# Altium footprint library Conectori.PcbLib: 65 footprints (part 4 of 5)
Each footprint in its own frame and in the unit in brackets; x right, y up, seen from the top. Pads: shape width x height; smd on the part's side, far side on the other; paste and mask are expansions set on the pad; w line width, h text height; cw(c..) or ccw(c..) is an arc to the next point about the centre after c.
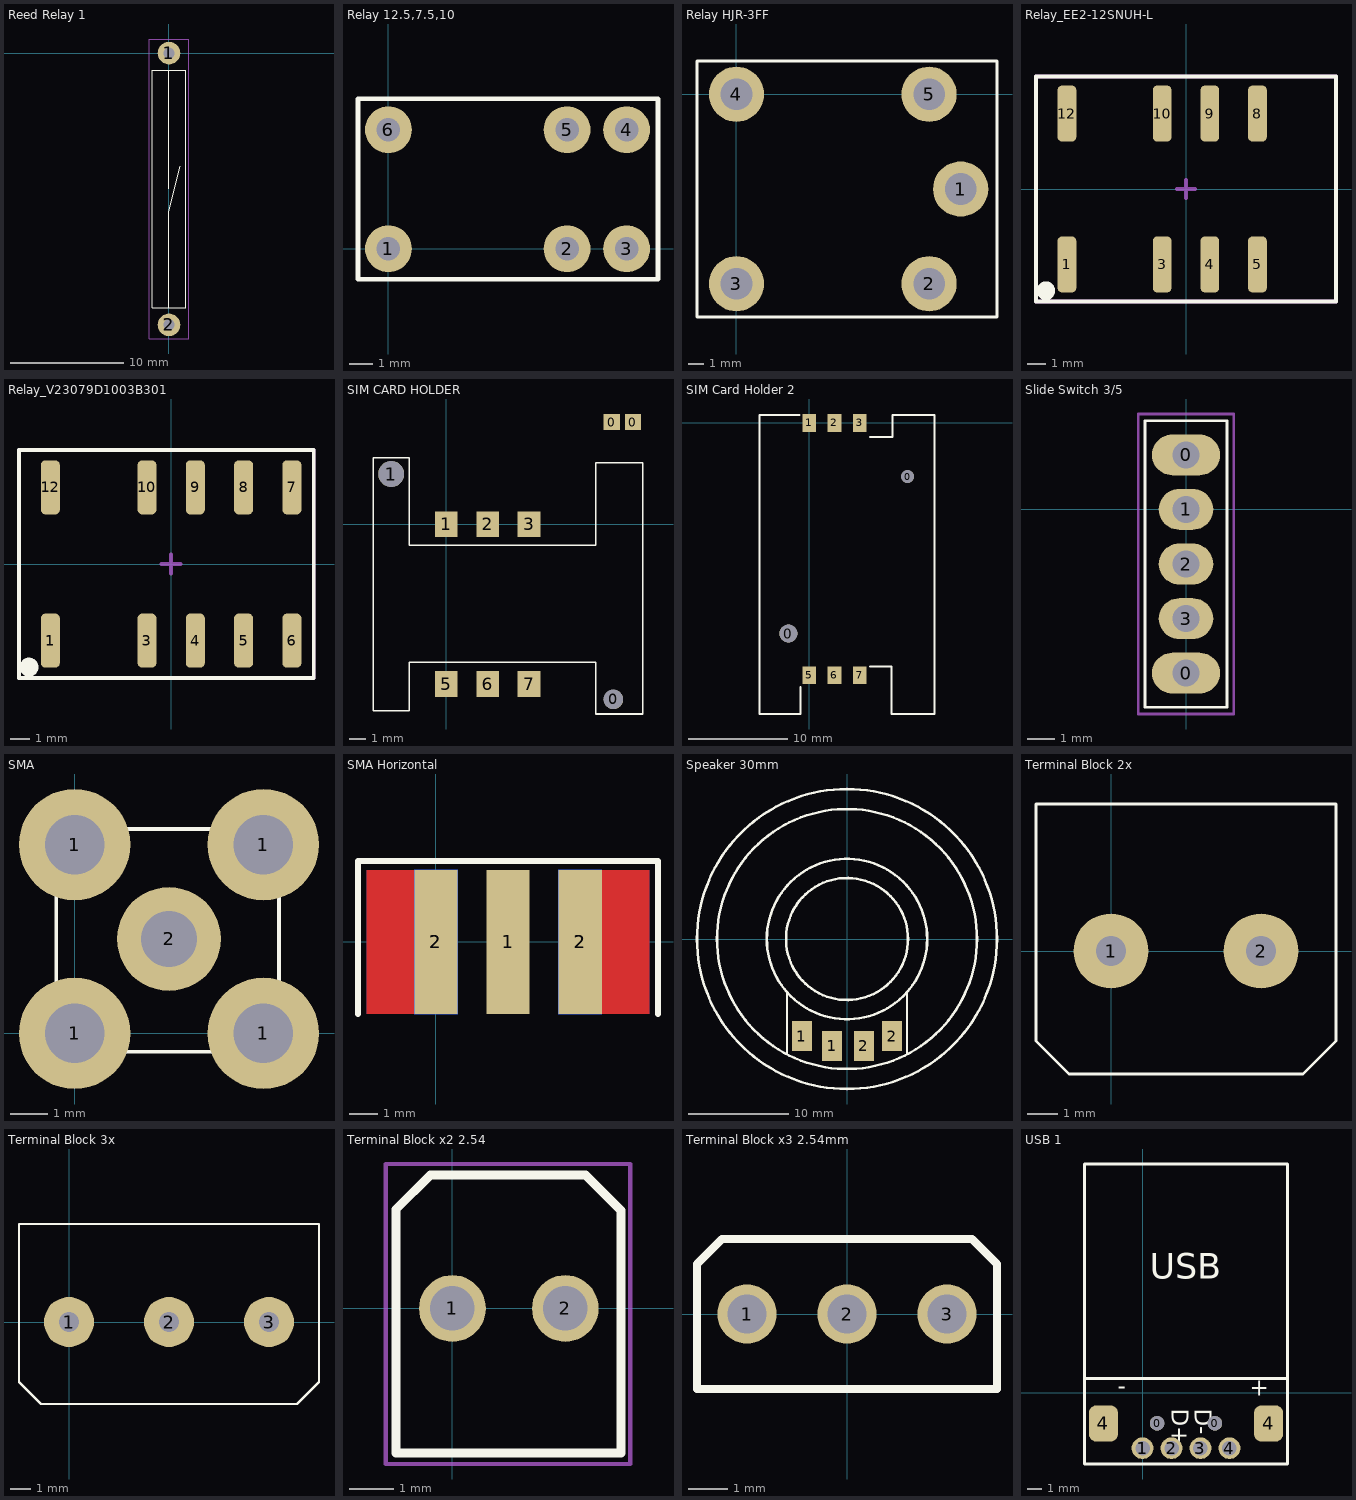
[diagram p3: the footprints below, top view; thin cyan lines are the x and y axes]

## Reed Relay 1 [mm]
height 2.3
pads (2):
  round 2 hole 1: 1(0,0) 2(0,-24)
Top Overlay:
  lines w0.1: 0,-22.5 0,-14 1,-10 ; 0,-12 0,-1.5 ; -1.5,-22.5 -1.5,-1.5 1.5,-1.5 1.5,-22.5 -1.5,-22.5
Mechanical 15:
  lines w0.1: -1.75,-25.25 -1.75,1.25 1.75,1.25 1.75,-3.5 1.75,-25.25 0.25,-25.25 -1.75,-25.25
3D body "User Library-BR.step": height 9, standoff -1, extent -4,-24.6 4,0.6

## Relay 12.5,7.5,10 [mm]
pads (6):
  round 2 hole 1: 1(0,0) 2(7.62,0) 3(10.16,0) 4(10.16,5.08) 5(7.62,5.08) 6(0,5.08)
Top Overlay:
  lines w0.2: -1.3,-1.3 -1.1,-1.3 11.5,-1.3 11.5,-1.2 11.5,6.4 -1.3,6.4 -1.3,-1.3
3D body: height 10, standoff 0, extent -1.3,-1.3 11.5,6.4

## Relay HJR-3FF [mm]
height 15.5
pads (5):
  round 3.5 hole 2: 1(14.2,-6) 2(12.2,-12) 3(0,-12) 4(0,0) 5(12.2,0)
Top Overlay:
  lines w0.2: -2.5,-14.1 11.7,-14.1 16.5,-14.1 16.5,-13.8 16.5,1.7 16.5,2.1 1.5,2.1 -2.5,2.1 -2.5,1.7 -2.5,-13.8 -2.5,-14.1
3D body: height 15.5, standoff 0, extent -2.5,-14.1 16.5,2.1

## Relay_EE2-12SNUH-L [mm] "Relay, SMD, 10 Pins"
height 10.5
pads (8):
  rrect50% 1x3 smd: 1(-6.35,-4.025) 3(-1.27,-4.025) 4(1.27,-4.025) 5(3.81,-4.025) 8(3.81,4.025) 9(1.27,4.025) 10(-1.27,4.025) 12(-6.35,4.025)
Top Overlay:
  circle w0.5: c-7.475,-5.425 r0.25
  lines w0.2: -8,-6 -8,6 8,6 8,-6 -8,-6
Mechanical 15:
  lines w0.2: -0.5,0 0.5,0 ; 0,-0.5 0,0.5 ; -8,-6 8,-6 8,6 -8,6 -8,-6
3D body: height 10.5, standoff 0, extent -7.4,-3.7 7.6,3.7

## Relay_V23079D1003B301 [mm] "Relay, SMD, 10 Pins"
height 10.5
pads (10):
  rrect50% 1x2.85 smd: 1(-6.35,-4.025) 3(-1.27,-4.025) 4(1.27,-4.025) 5(3.81,-4.025) 6(6.35,-4.025) 7(6.35,4.025) 8(3.81,4.025) 9(1.27,4.025) 10(-1.27,4.025) 12(-6.35,4.025)
Top Overlay:
  circle w0.5: c-7.475,-5.425 r0.25
  lines w0.2: -8,-6 7.5,-6 7.5,6 -8,6 -8,-6
Mechanical 15:
  lines w0.2: -0.5,0 0.5,0 ; 0,-0.5 0,0.5 ; -8,-6 -8,6 7.5,6 7.5,-6 -8,-6
3D body: height 10.5, standoff 0, extent -7.25,-3.6 7.25,3.6

## SIM CARD HOLDER [mm]
pads (10):
  rect 1x1 smd: 0(10.2,6.3) 0(11.5,6.3)
  round 1.2 hole 1.2: 0(10.3,-10.8)
  round 1.6 hole 1.6: 1(-3.4,3.1)
  rect 1.4x1.6 smd: 1(0,0) 2(2.55,0) 3(5.1,0) 5(0,-9.85) 6(2.55,-9.85) 7(5.1,-9.85)
Top Overlay:
  lines w0.1: -4.5,-11.5 -4.5,4.1 -2.3,4.1 -2.3,-1.3 5.025,-1.3 9.2,-1.3 9.2,3.8 12.1,3.8 12.1,0.075 12.1,-2 12.1,-11.5 12.1,-11.7 11.912,-11.7 9.2,-11.7 9.2,-10.7 9.2,-8.5 6.9,-8.5 0.4,-8.5 -2.3,-8.5 -2.3,-11 -2.3,-11.5 -4.5,-11.5
3D body: height 2.7, standoff 0, extent -4.5,-11.7 12.1,4.1

## SIM Card Holder 2 [mm]
pads (8):
  round 1.8 hole 1.8: 0(-2.1,-21.2)
  round 1.3 hole 1.3: 0(9.9,-5.4)
  rect 1.4x1.8 smd: 1(0,0) 2(2.54,0) 3(5.08,0) 5(0,-25.4) 6(2.54,-25.4) 7(5.08,-25.4)
Top Overlay:
  lines w0.2: -1,0.8 -4.8,0.8 -5,0.8 -5,-0.3 -5,-29.3 -3.9,-29.3 -0.9,-29.3 -0.9,-26.6 ; 6.1,-24.5 8.3,-24.5 8.3,-27.1 8.3,-29.3 8.6,-29.3 12.6,-29.3 12.6,-28.9 12.6,-9.5 12.6,0.8 9,0.8 8.4,0.8 8.4,-1.4 6.1,-1.4
3D body "User Library-SIM5060-6-0-26-01-A.STEP": height 2.6, standoff -0.7, extent -4.8,-29.11 12.4,0.53

## Slide Switch 3/5 [mm]
height 5
pads (5):
  oval 2.5x1.5 hole 1: 0(0,-6) 0(0,2)
  oval 2x1.5 hole 1: 1(0,0) 2(0,-2) 3(0,-4)
Top Overlay:
  lines w0.1: -1.5,-7.25 -1.5,3.25 1.5,3.25 1.5,-7.25 -1.5,-7.25
Mechanical 15:
  lines w0.1: -1.75,-7.5 -1.75,3.5 1.75,3.5 1.75,-7.5 -1.75,-7.5
3D body "User Library-CK_Slide.step": height 4.7, standoff -2.79, extent -6.25,-6.305 2.123,2.305

## SMA [mm]
pads (5):
  round 3 hole 1.6: 1(0,0) 1(0,5.08) 1(5.08,0) 1(5.08,5.08)
  round 2.8 hole 1.5: 2(2.54,2.54)
Top Overlay:
  lines w0.1: -0.5,-0.5 5.5,-0.5 5.5,5.5 -0.5,5.5 -0.5,-0.5
3D body: height 9.5, standoff 1.7, extent -0.436,-0.454 5.54,5.534
3D body: height 1.7, standoff 0, extent -0.5,-0.5 5.5,5.5

## SMA Horizontal [mm]
pads (5):
  rect 1.5x5 smd: 1(2.5,0) 2(0,0) 2(5,0)
  rect 1.5x5 smd far side: 2(0,0) 2(5,0)
Top Layer:
  rectangle: -2.4,-2.5 -0.7,2.5
  rectangle: 5.7,-2.5 7.4,2.5
Bottom Layer:
  rectangle: -2.4,-2.5 -0.7,2.5
  rectangle: 5.7,-2.5 7.4,2.5
Top Overlay:
  lines w0.2: -2.7,-2.5 -2.7,2.8 -1.1,2.8 5.4,2.8 6.1,2.8 7.7,2.8 7.7,-2.5
Top Solder:
  rectangle: -2.5,-2.6 -0.8,2.6
  rectangle: 5.8,-2.6 7.5,2.6
Bottom Solder:
  rectangle: -2.5,-2.6 -0.8,2.6
  rectangle: 5.8,-2.6 7.5,2.6
3D body "User Library-RP_SMA_PCB-1.step": height 4.46, standoff -3.46, extent -2.26,-14.7 7.26,2.75

## Speaker 30mm [mm]
pads (4):
  rect 2x3 smd: 1(-4.5,-9.7) 1(-1.5,-10.7) 2(1.7,-10.7) 2(4.5,-9.7)
Top Overlay:
  circle w0.254: c0,0 r6.1
  circle w0.254: c0,0 r15
  circle w0.254: c0,0 r13
  circle w0.254: c0,0 r8.016
  lines w0.2: -6,-11.5 -6,-5.3 ; 6,-11.5 6,-5.3
3D body: height 7, standoff 0, extent -10.039,-10.01 9.882,9.951
3D body: height 5, standoff 0, extent -15,-15 14.882,14.941

## Terminal Block 2x [mm]
height 12.5
pads (2):
  round 2.5 hole 1: 1(0,0) 2(5,0)
Top Overlay:
  lines w0.1: -2.5,-3 -2.5,4.9 7.5,4.9 7.5,-3 6.4,-4.1 -1.4,-4.1 -2.5,-3
3D body "User Library-Terminal block 2 POS.STEP": height 10, standoff -3.05, extent -2.58,-3.7 7.58,3.8

## Terminal Block 3x [mm]
height 12.5
pads (3):
  round 2.5 hole 1: 1(0,0) 2(5,0) 3(10,0)
Top Overlay:
  lines w0.1: -2.5,-3 -1.4,-4.1 11.4,-4.1 12.5,-3 12.5,4.9 -2.5,4.9 -2.5,-3
3D body: height 12.5, standoff 0, extent -2.5,-4.1 12.5,4.9

## Terminal Block x2 2.54 [mm]
height 5
pads (2):
  round 1.5 hole 1: 1(0,0) 2(2.54,0)
Top Overlay:
  lines w0.2: -1.27,-3.25 -1.27,2.23 -0.5,3 3,3 3.79,2.21 3.79,-3.25 -1.27,-3.25
Mechanical 15:
  lines w0.1: -1.5,-3.5 -1.5,3.25 4,3.25 4,0.5 4,-3.5 1.5,-3.5 -1.5,-3.5
3D body "User Library-Connector-2.step": height 8.64, standoff -1.91, extent -1.36,-3.25 3.86,2.973

## Terminal Block x3 2.54mm [mm]
height 1
pads (3):
  round 1.5 hole 1: 1(-2.54,0) 2(0,0) 3(2.54,0)
Top Overlay:
  lines w0.2: -3.81,-1.905 3.81,-1.905 3.81,1.27 3.175,1.905 -3.175,1.905 -3.81,1.27 -3.81,-1.905
3D body: height 5, standoff 0, extent -3.81,-1.905 3.81,1.905

## USB 1 [mm]
pads (8):
  round 1 hole 1: 0(1,-2.1) 0(5,-2.1)
  round 1.5 hole 1: 1(0,-3.81) 2(2,-3.81) 3(4,-3.81) 4(6,-3.81)
  rrect50% 2x2.5 smd: 4(-2.7,-2.1) 4(8.7,-2.1)
Top Overlay:
  lines w0.2: -4,1 -4,-4.9 10,-4.9 10,1 ; -4,1 10,1 ; -4,1 -4,15.8 10,15.8 10,1
  text "USB" at 0.5,7.3 h3
  text "+" at 7.4,-0.6 h2
  text "-" at -1.7,-0.5 h2
  text "D-" at 3.2,-1.1 h2
  text "D+" at 1.6,-1.1 h2